# Altium footprint library RPIadaptor.PcbLib: 85 footprints (part 1 of 6)
Each footprint in its own frame and in the unit in brackets; x right, y up, seen from the top. Pads: shape width x height; smd on the part's side, far side on the other; paste and mask are expansions set on the pad; w line width, h text height; cw(c..) or ccw(c..) is an arc to the next point about the centre after c.
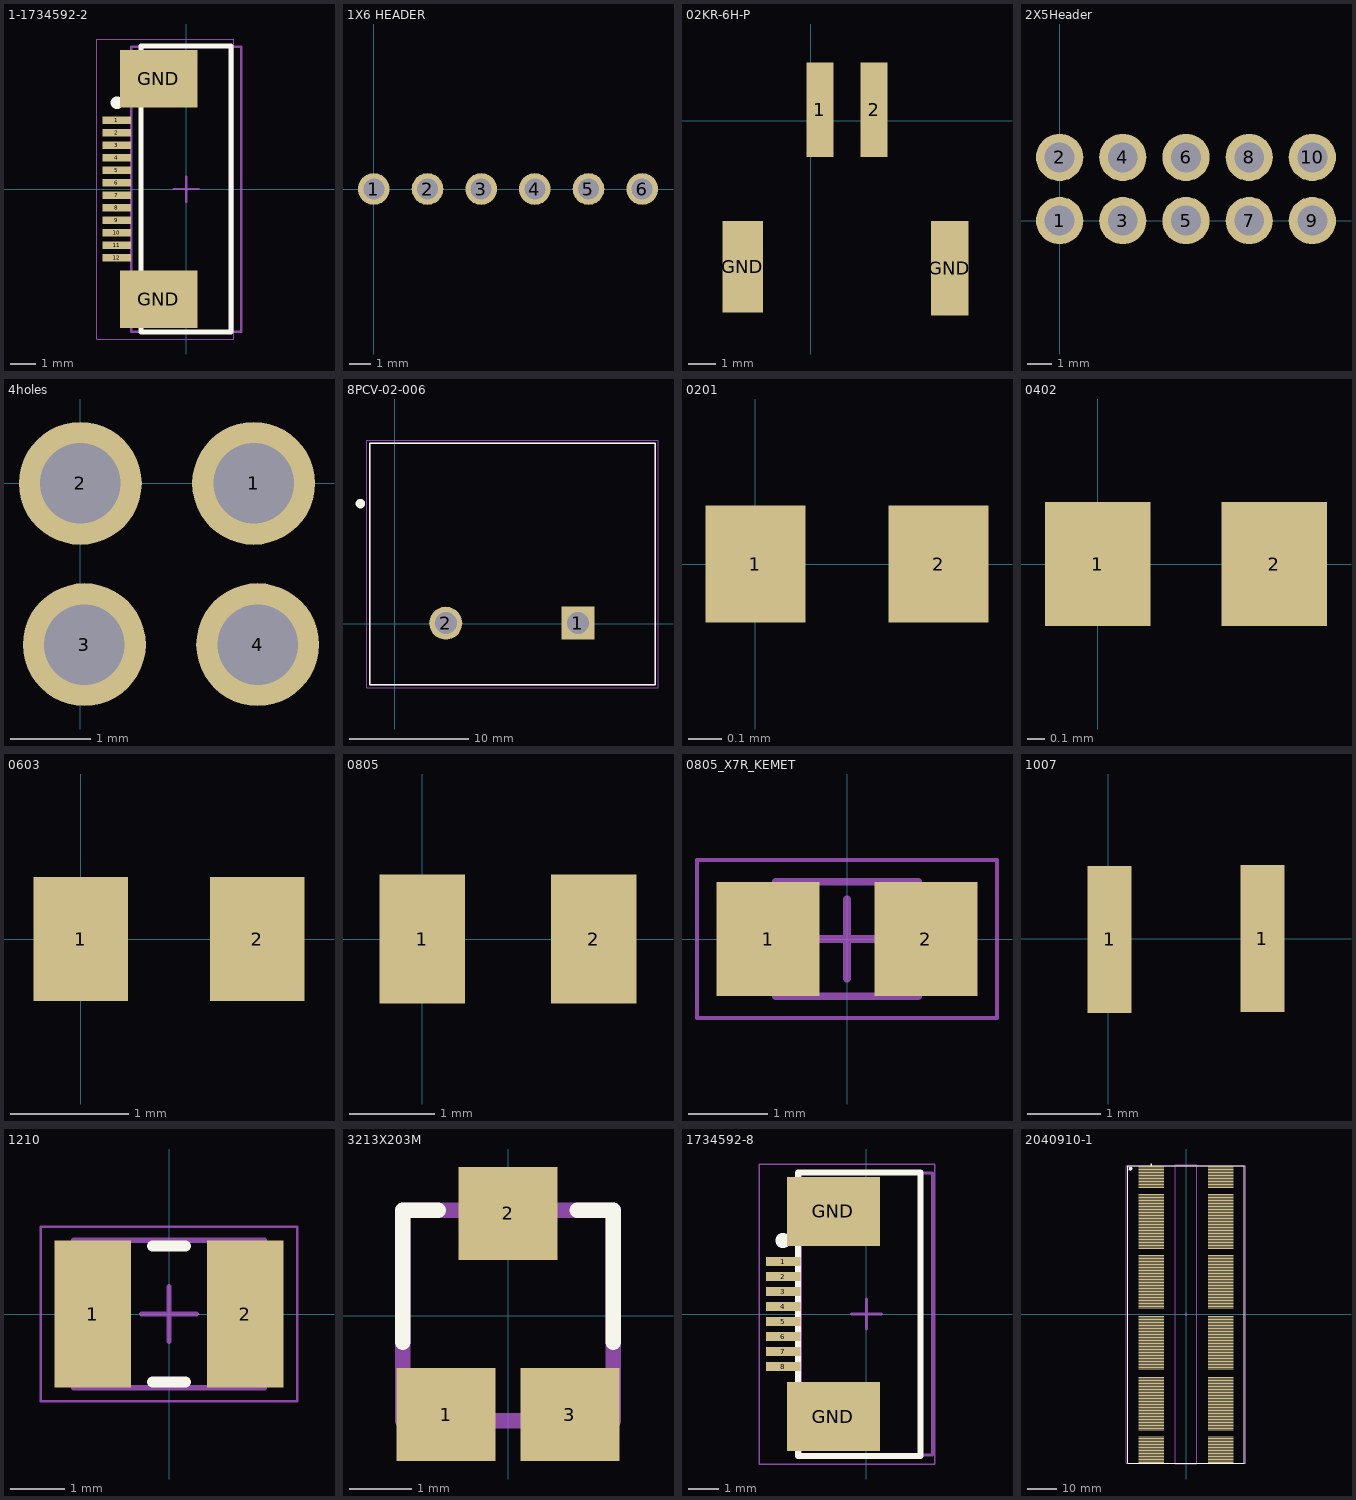
[diagram p0: the footprints below, top view; thin cyan lines are the x and y axes]

## 1-1734592-2 [mm] "FPC-style ribbon connector"
height 2
pads (14):
  rect 1.15x0.3 smd: 1(-2.775,2.75) 2(-2.775,2.25) 3(-2.775,1.75) 4(-2.775,1.25) 5(-2.775,0.75) 6(-2.775,0.25) 7(-2.775,-0.25) 8(-2.775,-0.75) 9(-2.775,-1.25) 10(-2.775,-1.75) 11(-2.775,-2.25) 12(-2.775,-2.75)
  rect 3.1x2.3 smd: GND(-1.1,4.42) GND(-1.1,-4.42)
Top Overlay:
  circle w0.25: c-2.775,3.45 r0.125
  circle w0.6: c-0.8,4.725 r0.3
  lines w0.2: -1.8,-5.725 -1.8,5.725 1.8,5.725 1.8,-5.725 -1.8,-5.725
Mechanical 13:
  circle w0.1: c-1.3,4.8 r0.5
  lines w0.1: -2.2,-5.7 -2.2,5.7 2.2,5.7 2.2,-5.7 -2.2,-5.7
Mechanical 15:
  lines w0.05: -3.575,-6 -3.575,6 1.905,6 1.905,-6 -3.575,-6
  lines w0.1: -0.5,0 0.5,0 ; 0,-0.5 0,0.5
3D body "c-1-1734592-2-c-3d.stp": height 2, standoff -0.05, extent -2.936,-5.715 2.174,5.715

## 1X6 HEADER [mm]
pads (6):
  round 1.5 hole 1: 1(0,0) 2(2.54,0) 3(5.08,0) 4(7.62,0) 5(10.16,0) 6(12.7,0)

## 02KR-6H-P [mm] "2 Position Rectangular Socket Connector IDC Tin 26 AWG"
height 5.5
pads (4):
  rect 1x3.5 smd: 1(0.35,0.4) 2(2.35,0.4)
  rect 1.5x3.4 smd: GND(-2.5,-5.4)
  rect 1.4x3.5 smd: GND(5.15,-5.45)
3D body: height 5.5, standoff 0, extent -3.15,-7.025 5.75,1.95

## 2X5Header [mm]
pads (10):
  round 1.9 hole 1.2: 1(0,0) 2(0,2.54) 3(2.54,0) 4(2.54,2.54) 5(5.08,0) 6(5.08,2.54) 7(7.62,0) 8(7.62,2.54) 9(10.16,0) 10(10.16,2.54)

## 4holes [mm]
pads (4):
  round 1.524 hole 1: 1(2.15,0) 2(0,0) 3(0.05,-2) 4(2.2,-2)

## 8PCV-02-006 [mil]
pads (2):
  rect 109.5x109.5 hole 73: 1(607,2)
  round 109.5 hole 73: 2(169,2)
Top Overlay:
  circle w15.75: c-113.98,398 r7.87
  lines w5: -83.5,-202 863.5,-202 863.5,598 -83.5,598 -83.5,-202
Mechanical 4:
  lines w5: -83.5,-202 863.5,-202 ; -83.5,-202 -83.5,598 ; -83.5,-202 863.5,-202 ; -83.5,-202 -83.5,598 ; -83.5,598 863.5,598 ; -83.5,598 863.5,598 ; 863.5,-202 863.5,598 ; 863.5,-202 863.5,598
Mechanical 16:
  lines w1.97: -92.28,-211.84 872.28,-211.84 872.28,607.84 -92.28,607.84 -92.28,-211.84
3D body "c-5-1437657-7-r-3d.stp": height 770, standoff -185, extent -81,-205 867,595

## 0201 [mm]
pads (2):
  rect 0.3x0.35 smd: 1(0,0) 2(0.55,0)
3D body "User Library-0201(0603M) Cap.STEP": height 0.28, standoff -0.03, extent -0.025,-0.152 0.584,0.153

## 0402 [mm]
pads (2):
  rect 0.6x0.7 smd: 1(0,0) 2(1,0)
3D body "User Library-0402(1005M) Cap.STEP": height 0.49, standoff -0.03, extent -0.025,-0.254 0.991,0.254

## 0603 [mm]
pads (2):
  rect 0.8x1.05 smd: 1(0,0) 2(1.5,0)
3D body "User Library-CapCeramic_Kemet_0603_1608.STEP": height 0.8, standoff 0, extent -0.063,-0.4 1.537,0.4

## 0805 [mm]
pads (2):
  rect 1x1.5 smd: 1(0,0) 2(2,0)
3D body "User Library-CAP0805-1.STEP": height 1.25, standoff 0, extent 0.016,-0.65 2.016,0.6

## 0805_X7R_KEMET [mm]
height 0.88
pads (2):
  rect 1.3x1.45 smd: 1(-1,0) 2(1,0)
Mechanical 13:
  lines w0.1: -0.9,-0.725 -0.9,0.725 0.9,0.725 0.9,-0.725 -0.9,-0.725
Mechanical 15:
  lines w0.05: -1.9,-1 -1.9,1 1.9,1 1.9,-1 -1.9,-1
  lines w0.1: -0.5,0 0.5,0 ; 0,-0.5 0,0.5
3D body "C0805C104K5RACTU.step": height 0.88, standoff 0, extent -0.9,-0.725 0.9,0.725

## 1007 [mm]
pads (2):
  rect 0.6x2 smd: 1(0.02,-0.01) 1(2.1,0)
3D body "User Library-IND_1007.step": height 1.8, standoff 0, extent -0.22,-0.89 2.28,0.91

## 1210 [mm]
height 2.8
pads (2):
  rect 1.4x2.7 smd: 1(-1.4,0) 2(1.4,0)
Top Overlay:
  lines w0.2: -0.3,-1.25 0.3,-1.25 ; -0.3,1.25 0.3,1.25
Mechanical 13:
  lines w0.1: -1.75,-1.35 1.75,-1.35 1.75,1.35 -1.75,1.35 -1.75,-1.35
Mechanical 15:
  lines w0.05: -2.35,-1.6 2.35,-1.6 2.35,1.6 -2.35,1.6 -2.35,-1.6
  lines w0.1: -0.5,0 0.5,0 ; 0,-0.5 0,0.5
3D body "1210_X7R_KEMET_above4.7uF.step": height 2.8, standoff 0, extent -1.75,-1.35 1.75,1.35

## 3213X203M [mm]
pads (3):
  rect 1.6x1.5 smd: 1(-1,-1.6) 2(0,1.65) 3(1,-1.6)
Top Overlay:
  lines w0.254: -1.7,-0.428 -1.7,1.7 -1.128,1.7 ; 1.118,1.7 1.7,1.7 1.7,-0.428
Mechanical 13:
  lines w0.254: -1.7,-1.7 1.7,-1.7 1.7,1.7 -1.7,1.7 -1.7,-1.7
3D body "3313J-001.stp": height 2.16, standoff 0.03, extent -1.651,-1.676 1.651,1.829

## 1734592-8 [mm]
height 2
pads (10):
  rect 1.15x0.3 smd: 1(-2.775,1.75) 2(-2.775,1.25) 3(-2.775,0.75) 4(-2.775,0.25) 5(-2.775,-0.25) 6(-2.775,-0.75) 7(-2.775,-1.25) 8(-2.775,-1.75)
  rect 3.1x2.3 smd: GND(-1.1,-3.42) GND(-1.1,3.42)
Top Overlay:
  circle w0.25: c-2.775,2.45 r0.125
  circle w0.6: c-0.8,3.725 r0.3
  lines w0.2: -2.286,-4.725 -2.286,4.725 1.8,4.725 1.8,-4.725 -2.286,-4.725
Mechanical 13:
  circle w0.1: c-1.3,3.8 r0.5
  lines w0.1: -2.2,-4.7 -2.2,4.7 2.2,4.7 2.2,-4.7 -2.2,-4.7
Mechanical 15:
  lines w0.05: -3.575,-5 -3.575,5 2.286,5 2.286,-5 -3.575,-5
  lines w0.1: -0.5,0 0.5,0 ; 0,-0.5 0,0.5
3D body "c-1734592-8-c-3d.stp": height 2, standoff -0.05, extent -3.068,-4.715 2.042,4.715

## 2040910-1 [mm]
height 10
pads (400):
  rect 0x0.3 smd: 1(-11.65,49.75) 2(-11.65,49.25) 3(-11.65,48.75) 4(-11.65,48.25) 5(-11.65,47.75) 6(-11.65,47.25) 7(-11.65,46.75) 8(-11.65,46.25) 9(-11.65,45.75) 10(-11.65,45.25) 11(-11.65,44.75) 12(-11.65,44.25) 13(-11.65,43.75) 14(-11.65,43.25) 15(-11.65,42.75) 16(-11.65,42.25) 17(-11.65,41.75) 18(-11.65,41.25) 19(-11.65,40.75) 20(-11.65,40.25) 21(-11.65,39.75) 22(-11.65,39.25) 23(-11.65,38.75) 24(-11.65,38.25) 25(-11.65,37.75) 26(-11.65,37.25) 27(-11.65,36.75) 28(-11.65,36.25) 29(-11.65,35.75) 30(-11.65,35.25) 31(-11.65,34.75) 32(-11.65,34.25) 33(-11.65,33.75) 34(-11.65,33.25) 35(-11.65,32.75) 36(-11.65,32.25) 37(-11.65,31.75) 38(-11.65,31.25) 39(-11.65,30.75) 40(-11.65,30.25) 41(-11.65,29.75) 42(-11.65,29.25) 43(-11.65,28.75) 44(-11.65,28.25) 45(-11.65,27.75) 46(-11.65,27.25) 47(-11.65,26.75) 48(-11.65,26.25) 49(-11.65,25.75) 50(-11.65,25.25) 51(-11.65,24.75) 52(-11.65,24.25) 53(-11.65,23.75) 54(-11.65,23.25) 55(-11.65,22.75) 56(-11.65,22.25) 57(-11.65,21.75) 58(-11.65,21.25) 59(-11.65,20.75) 60(-11.65,20.25) 61(-11.65,19.75) 62(-11.65,19.25) 63(-11.65,18.75) 64(-11.65,18.25) 65(-11.65,17.75) 66(-11.65,17.25) 67(-11.65,16.75) 68(-11.65,16.25) 69(-11.65,15.75) 70(-11.65,15.25) 71(-11.65,14.75) 72(-11.65,14.25) 73(-11.65,13.75) 74(-11.65,13.25) 75(-11.65,12.75) 76(-11.65,12.25) 77(-11.65,11.75) 78(-11.65,11.25) 79(-11.65,10.75) 80(-11.65,10.25) 81(-11.65,9.75) 82(-11.65,9.25) 83(-11.65,8.75) 84(-11.65,8.25) 85(-11.65,7.75) 86(-11.65,7.25) 87(-11.65,6.75) 88(-11.65,6.25) 89(-11.65,5.75) 90(-11.65,5.25) 91(-11.65,4.75) 92(-11.65,4.25) 93(-11.65,3.75) 94(-11.65,3.25) 95(-11.65,2.75) 96(-11.65,2.25) 97(-11.65,1.75) 98(-11.65,1.25) 99(-11.65,0.75) 100(-11.65,0.25) 101(-11.65,-0.25) 102(-11.65,-0.75) 103(-11.65,-1.25) 104(-11.65,-1.75) 105(-11.65,-2.25) 106(-11.65,-2.75) 107(-11.65,-3.25) 108(-11.65,-3.75) 109(-11.65,-4.25) 110(-11.65,-4.75) 111(-11.65,-5.25) 112(-11.65,-5.75) 113(-11.65,-6.25) 114(-11.65,-6.75) 115(-11.65,-7.25) 116(-11.65,-7.75) 117(-11.65,-8.25) 118(-11.65,-8.75) 119(-11.65,-9.25) 120(-11.65,-9.75) 121(-11.65,-10.25) 122(-11.65,-10.75) 123(-11.65,-11.25) 124(-11.65,-11.75) 125(-11.65,-12.25) 126(-11.65,-12.75) 127(-11.65,-13.25) 128(-11.65,-13.75) 129(-11.65,-14.25) 130(-11.65,-14.75) 131(-11.65,-15.25) 132(-11.65,-15.75) 133(-11.65,-16.25) 134(-11.65,-16.75) 135(-11.65,-17.25) 136(-11.65,-17.75) 137(-11.65,-18.25) 138(-11.65,-18.75) 139(-11.65,-19.25) 140(-11.65,-19.75) 141(-11.65,-20.25) 142(-11.65,-20.75) 143(-11.65,-21.25) 144(-11.65,-21.75) 145(-11.65,-22.25) 146(-11.65,-22.75) 147(-11.65,-23.25) 148(-11.65,-23.75) 149(-11.65,-24.25) 150(-11.65,-24.75) 151(-11.65,-25.25) 152(-11.65,-25.75) 153(-11.65,-26.25) 154(-11.65,-26.75) 155(-11.65,-27.25) 156(-11.65,-27.75) 157(-11.65,-28.25) 158(-11.65,-28.75) 159(-11.65,-29.25) 160(-11.65,-29.75) 161(-11.65,-30.25) 162(-11.65,-30.75) 163(-11.65,-31.25) 164(-11.65,-31.75) 165(-11.65,-32.25) 166(-11.65,-32.75) 167(-11.65,-33.25) 168(-11.65,-33.75) 169(-11.65,-34.25) 170(-11.65,-34.75) 171(-11.65,-35.25) 172(-11.65,-35.75) 173(-11.65,-36.25) 174(-11.65,-36.75) 175(-11.65,-37.25) 176(-11.65,-37.75) 177(-11.65,-38.25) 178(-11.65,-38.75) 179(-11.65,-39.25) 180(-11.65,-39.75) 181(-11.65,-40.25) 182(-11.65,-40.75) 183(-11.65,-41.25) 184(-11.65,-41.75) 185(-11.65,-42.25) 186(-11.65,-42.75) 187(-11.65,-43.25) 188(-11.65,-43.75) 189(-11.65,-44.25) 190(-11.65,-44.75) 191(-11.65,-45.25) 192(-11.65,-45.75) 193(-11.65,-46.25) 194(-11.65,-46.75) 195(-11.65,-47.25) 196(-11.65,-47.75) 197(-11.65,-48.25) 198(-11.65,-48.75) 199(-11.65,-49.25) 200(-11.65,-49.75) 201(11.65,-49.75) 202(11.65,-49.25) 203(11.65,-48.75) 204(11.65,-48.25) 205(11.65,-47.75) 206(11.65,-47.25) 207(11.65,-46.75) 208(11.65,-46.25) 209(11.65,-45.75) 210(11.65,-45.25) 211(11.65,-44.75) 212(11.65,-44.25) 213(11.65,-43.75) 214(11.65,-43.25) 215(11.65,-42.75) 216(11.65,-42.25) 217(11.65,-41.75) 218(11.65,-41.25) 219(11.65,-40.75) 220(11.65,-40.25) 221(11.65,-39.75) 222(11.65,-39.25) 223(11.65,-38.75) 224(11.65,-38.25) 225(11.65,-37.75) 226(11.65,-37.25) 227(11.65,-36.75) 228(11.65,-36.25) 229(11.65,-35.75) 230(11.65,-35.25) 231(11.65,-34.75) 232(11.65,-34.25) 233(11.65,-33.75) 234(11.65,-33.25) 235(11.65,-32.75) 236(11.65,-32.25) 237(11.65,-31.75) 238(11.65,-31.25) 239(11.65,-30.75) 240(11.65,-30.25) 241(11.65,-29.75) 242(11.65,-29.25) 243(11.65,-28.75) 244(11.65,-28.25) 245(11.65,-27.75) 246(11.65,-27.25) 247(11.65,-26.75) 248(11.65,-26.25) 249(11.65,-25.75) 250(11.65,-25.25) 251(11.65,-24.75) 252(11.65,-24.25) 253(11.65,-23.75) 254(11.65,-23.25) 255(11.65,-22.75) 256(11.65,-22.25) 257(11.65,-21.75) 258(11.65,-21.25) 259(11.65,-20.75) 260(11.65,-20.25) 261(11.65,-19.75) 262(11.65,-19.25) 263(11.65,-18.75) 264(11.65,-18.25) 265(11.65,-17.75) 266(11.65,-17.25) 267(11.65,-16.75) 268(11.65,-16.25) 269(11.65,-15.75) 270(11.65,-15.25) 271(11.65,-14.75) 272(11.65,-14.25) 273(11.65,-13.75) 274(11.65,-13.25) 275(11.65,-12.75) 276(11.65,-12.25) 277(11.65,-11.75) 278(11.65,-11.25) 279(11.65,-10.75) 280(11.65,-10.25) 281(11.65,-9.75) 282(11.65,-9.25) 283(11.65,-8.75) 284(11.65,-8.25) 285(11.65,-7.75) 286(11.65,-7.25) 287(11.65,-6.75) 288(11.65,-6.25) 289(11.65,-5.75) 290(11.65,-5.25) 291(11.65,-4.75) 292(11.65,-4.25) 293(11.65,-3.75) 294(11.65,-3.25) 295(11.65,-2.75) 296(11.65,-2.25) 297(11.65,-1.75) 298(11.65,-1.25) 299(11.65,-0.75) 300(11.65,-0.25) 301(11.65,0.25) 302(11.65,0.75) 303(11.65,1.25) 304(11.65,1.75) 305(11.65,2.25) 306(11.65,2.75) 307(11.65,3.25) 308(11.65,3.75) 309(11.65,4.25) 310(11.65,4.75) 311(11.65,5.25) 312(11.65,5.75) 313(11.65,6.25) 314(11.65,6.75) 315(11.65,7.25) 316(11.65,7.75) 317(11.65,8.25) 318(11.65,8.75) 319(11.65,9.25) 320(11.65,9.75) 321(11.65,10.25) 322(11.65,10.75) 323(11.65,11.25) 324(11.65,11.75) 325(11.65,12.25) 326(11.65,12.75) 327(11.65,13.25) 328(11.65,13.75) 329(11.65,14.25) 330(11.65,14.75) 331(11.65,15.25) 332(11.65,15.75) 333(11.65,16.25) 334(11.65,16.75) 335(11.65,17.25) 336(11.65,17.75) 337(11.65,18.25) 338(11.65,18.75) 339(11.65,19.25) 340(11.65,19.75) 341(11.65,20.25) 342(11.65,20.75) 343(11.65,21.25) 344(11.65,21.75) 345(11.65,22.25) 346(11.65,22.75) 347(11.65,23.25) 348(11.65,23.75) 349(11.65,24.25) 350(11.65,24.75) 351(11.65,25.25) 352(11.65,25.75) 353(11.65,26.25) 354(11.65,26.75) 355(11.65,27.25) 356(11.65,27.75) 357(11.65,28.25) 358(11.65,28.75) 359(11.65,29.25) 360(11.65,29.75) 361(11.65,30.25) 362(11.65,30.75) 363(11.65,31.25) 364(11.65,31.75) 365(11.65,32.25) 366(11.65,32.75) 367(11.65,33.25) 368(11.65,33.75) 369(11.65,34.25) 370(11.65,34.75) 371(11.65,35.25) 372(11.65,35.75) 373(11.65,36.25) 374(11.65,36.75) 375(11.65,37.25) 376(11.65,37.75) 377(11.65,38.25) 378(11.65,38.75) 379(11.65,39.25) 380(11.65,39.75) 381(11.65,40.25) 382(11.65,40.75) 383(11.65,41.25) 384(11.65,41.75) 385(11.65,42.25) 386(11.65,42.75) 387(11.65,43.25) 388(11.65,43.75) 389(11.65,44.25) 390(11.65,44.75) 391(11.65,45.25) 392(11.65,45.75) 393(11.65,46.25) 394(11.65,46.75) 395(11.65,47.25) 396(11.65,47.75) 397(11.65,48.25) 398(11.65,48.75) 399(11.65,49.25) 400(11.65,49.75)
Top Overlay:
  circle w0.6: c-18.6,49 r0.3
  circle w0.25: c-11.65,50.45 r0.125
  lines w0.2: -19.6,-50 19.6,-50 19.6,50 -19.6,50 -19.6,-50
Mechanical 13:
  circle w0.1: c-19.1,49.1 r0.5
  lines w0.1: -20,-50 20,-50 20,50 -20,50 -20,-50
Mechanical 15:
  lines w0.05: -3.575,-50.25 3.575,-50.25 3.575,50.25 -3.575,50.25 -3.575,-50.25
  lines w0.1: -0.5,0 0.5,0 ; 0,-0.5 0,0.5
3D body "c-2040910-1-d-3d.stp": height 6.2, standoff -2.2, extent -20.573,-39.795 -4.573,40.005